# Altium footprint library 19-Resistors.PcbLib: 199 footprints (part 11 of 13)
Each footprint in its own frame and in the unit in brackets; x right, y up, seen from the top. Pads: shape width x height; smd on the part's side, far side on the other; paste and mask are expansions set on the pad; w line width, h text height; cw(c..) or ccw(c..) is an arc to the next point about the centre after c.
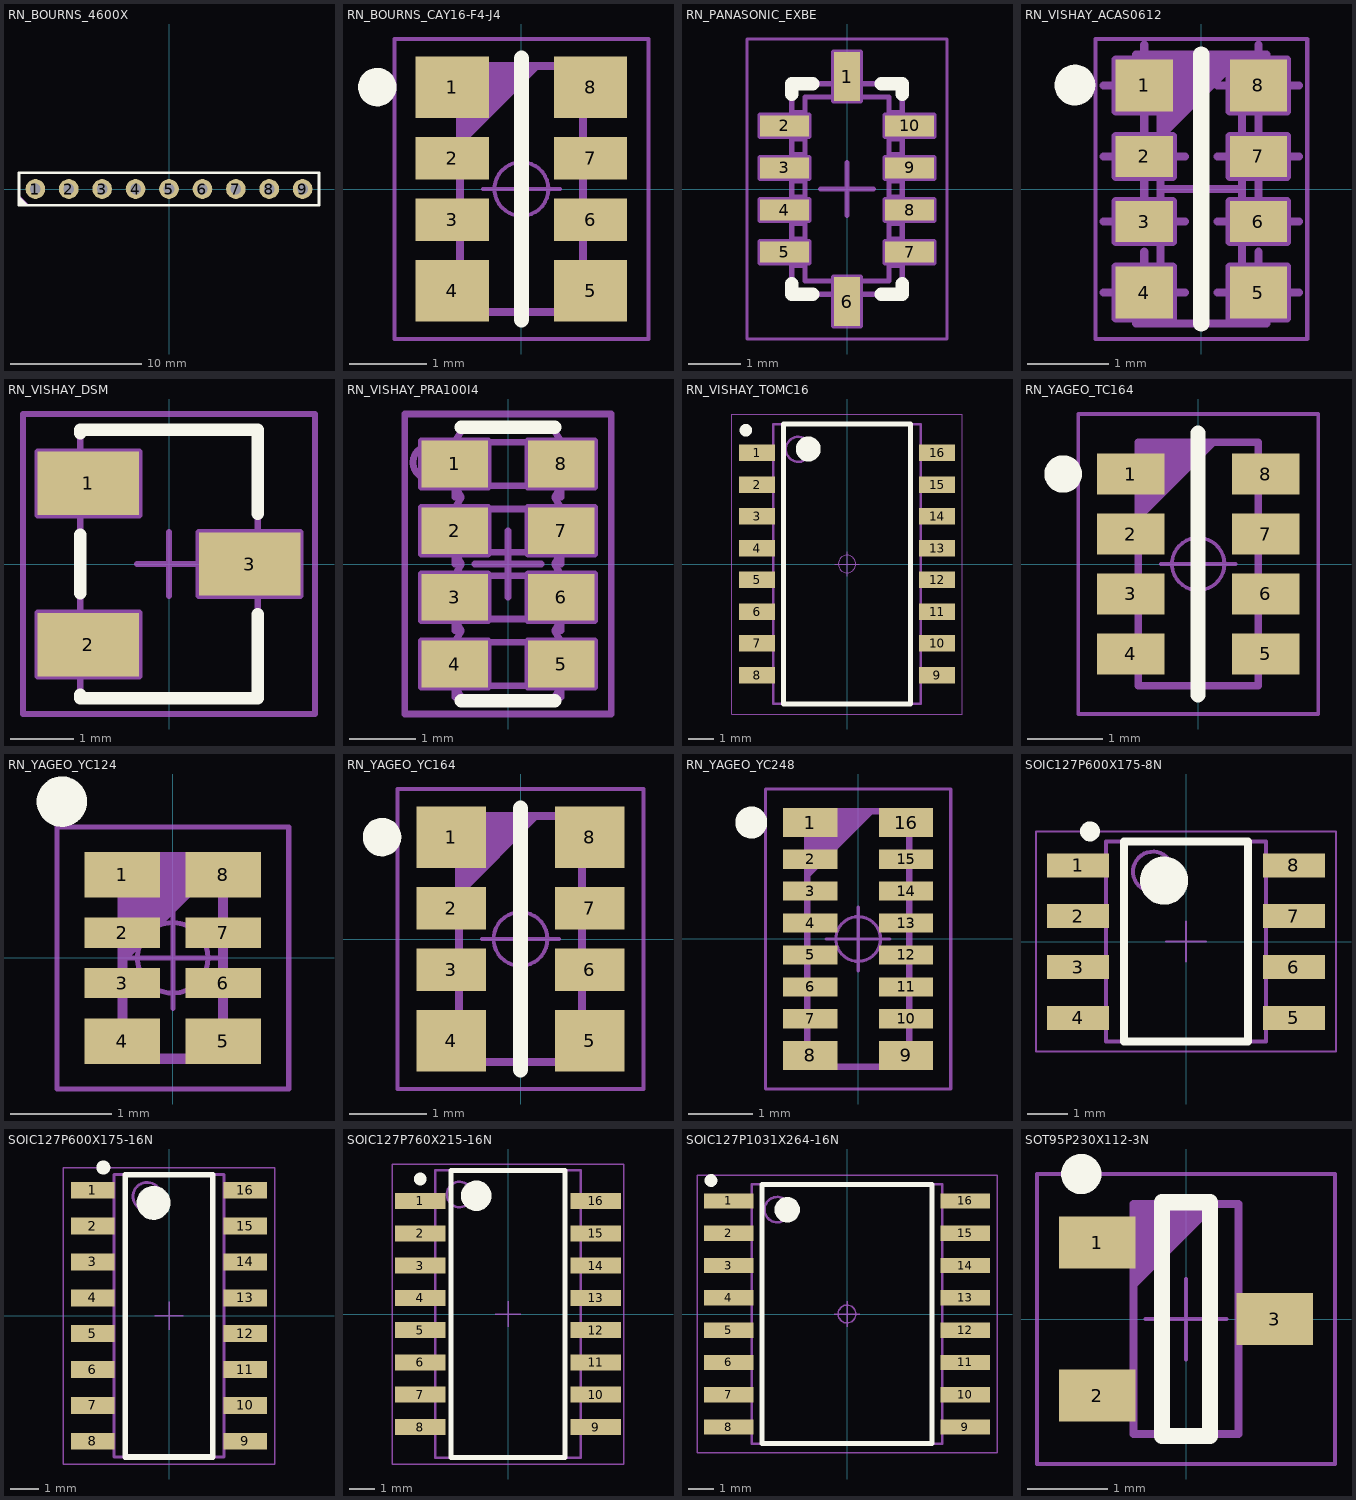
[diagram p10: the footprints below, top view; thin cyan lines are the x and y axes]

## RN_BOURNS_4600X [mm] "SIP-9 Resistor Network, Body 22.81x 2.49mm, Bourns Serie 4600X"
height 5.08
pads (9):
  round 1.5 hole 0.8: 1(-10.16,0) 2(-7.62,0) 3(-5.08,0) 4(-2.54,0) 5(0,0) 6(2.54,0) 7(5.08,0) 8(7.62,0) 9(10.16,0)
Top Overlay:
  lines w0.2: -11.39,-1.09 -11.24,-1.24 ; -11.39,-0.94 -11.09,-1.24 ; -11.39,-0.815 -10.965,-1.24 ; -11.39,-0.64 -10.79,-1.24 ; -11.405,-1.245 11.405,-1.245 11.405,1.245 -11.405,1.245 -11.405,-1.245
Mechanical 8:
  lines w0.127: -10.66,0 -10.16,0 ; -10.16,-0.5 -10.16,0 ; -10.16,0.5 -10.16,0 ; -9.66,0 -10.16,0 ; -8.12,0 -7.62,0 ; -7.62,-0.5 -7.62,0 ; -7.62,0.5 -7.62,0 ; -7.12,0 -7.62,0 ; -5.58,0 -5.08,0 ; -5.08,-0.5 -5.08,0 ; -5.08,0.5 -5.08,0 ; -4.58,0 -5.08,0 ; -3.04,0 -2.54,0 ; -2.54,-0.5 -2.54,0 ; -2.54,0.5 -2.54,0 ; -2.04,0 -2.54,0 ; -0.5,0 0,0 ; 0,-0.5 0,0 ; 0,0.5 0,0 ; 0.5,0 0,0 ; 2.04,0 2.54,0 ; 2.54,-0.5 2.54,0 ; 2.54,0.5 2.54,0 ; 3.04,0 2.54,0 ; 4.58,0 5.08,0 ; 5.08,-0.5 5.08,0 ; 5.08,0.5 5.08,0 ; 5.58,0 5.08,0 ; 7.12,0 7.62,0 ; 7.62,-0.5 7.62,0 ; 7.62,0.5 7.62,0 ; 8.12,0 7.62,0 ; 9.66,0 10.16,0 ; 10.16,-0.5 10.16,0 ; 10.16,0.5 10.16,0 ; 10.66,0 10.16,0
Mechanical 14:
  lines w0.1: -11.39,-1.165 -11.315,-1.24 ; -11.39,-1.065 -11.215,-1.24 ; -11.39,-0.99 -11.14,-1.24 ; -11.39,-0.915 -11.065,-1.24 ; -11.39,-0.84 -10.99,-1.24 ; -11.39,-0.765 -10.915,-1.24 ; -11.39,-0.69 -10.84,-1.24 ; -11.39,-0.565 -10.715,-1.24 ; -11.405,-1.245 11.405,-1.245 11.405,1.245 -11.405,1.245 -11.405,-1.245
3D body "v200-130.stp": height 0.02, standoff -1.65, extent 9.16,-1 11.16,1
3D body "v200-130.stp": height 0.02, standoff -1.65, extent 6.62,-1 8.62,1
3D body "v200-130.stp": height 0.02, standoff -1.65, extent 4.08,-1 6.08,1
3D body "v200-130.stp": height 0.02, standoff -1.65, extent 1.54,-1 3.54,1
3D body "v200-130.stp": height 0.02, standoff -1.65, extent -1,-1 1,1
3D body "v200-130.stp": height 0.02, standoff -1.65, extent -3.54,-1 -1.54,1
3D body "v200-130.stp": height 0.02, standoff -1.65, extent -6.08,-1 -4.08,1
3D body "v200-130.stp": height 0.02, standoff -1.65, extent -8.62,-1 -6.62,1
3D body "v200-130.stp": height 0.02, standoff -1.65, extent -11.16,-1 -9.16,1
3D body "RN_BOURNS_4600X.stp": height 5.08, standoff -3.43, extent -11.405,-1.245 11.405,1.245

## RN_BOURNS_CAY16-F4-J4 [mm] "Resistor, Chip Array, Convex S Version, Pitch 0.80mm, 8-Leads,1.6x3.2mm, BOURNS Type CAY16-F4 or J4, IPC Medium Density"
height 0.6
pads (8):
  rect 0.95x0.8 smd: 1(-0.9,1.325) 4(-0.9,-1.325) 5(0.9,-1.325) 8(0.9,1.325)
  rect 0.95x0.55 smd: 2(-0.9,0.4) 3(-0.9,-0.4) 6(0.9,-0.4) 7(0.9,0.4)
Top Overlay:
  circle w0.25: c-1.875,1.325 r0.125
  lines w0.2: 0,-1.7 0,1.7
Mechanical 14:
  lines w0.1: -0.8,-1.6 -0.8,1.6 0.8,1.6 0.8,-1.6 -0.8,-1.6 ; -0.8,0.6 0.2,1.6 -0.8,0.6 ; -0.8,0.7 0.1,1.6 -0.8,0.7 ; -0.8,0.8 0,1.6 -0.8,0.8 ; -0.8,0.9 -0.1,1.6 -0.8,0.9 ; -0.8,1 -0.2,1.6 -0.8,1 ; -0.8,1.1 -0.3,1.6 -0.8,1.1 ; -0.8,1.2 -0.4,1.6 -0.8,1.2 ; -0.8,1.3 -0.5,1.6 -0.8,1.3 ; -0.8,1.4 -0.6,1.6 -0.8,1.4 ; -0.8,1.5 -0.7,1.6 -0.8,1.5
Mechanical 15:
  circle w0.05: c0,0 r0.35
  lines w0.05: -0.5,0 0.5,0 ; 0,-0.5 0,0.5 ; -1.65,-1.95 -1.65,1.95 1.65,1.95 1.65,-1.95 -1.65,-1.95
3D body "p095-055.stp": height 0.02, standoff 0, extent -1.375,-0.675 -0.425,-0.125
3D body "p095-055.stp": height 0.02, standoff 0, extent -1.375,0.125 -0.425,0.675
3D body "p095-055.stp": height 0.02, standoff 0, extent 0.425,-0.675 1.375,-0.125
3D body "p095-055.stp": height 0.02, standoff 0, extent 0.425,0.125 1.375,0.675
3D body "p095-080.stp": height 0.02, standoff 0, extent 0.425,-1.725 1.375,-0.925
3D body "p095-080.stp": height 0.02, standoff 0, extent -1.375,-1.725 -0.425,-0.925
3D body "p095-080.stp": height 0.02, standoff 0, extent 0.425,0.925 1.375,1.725
3D body "p095-080.stp": height 0.02, standoff 0, extent -1.375,0.925 -0.425,1.725
3D body "RN_BOURNS_CAY16-F4-J4.stp": height 0.5, standoff 0, extent -0.8,-1.65 0.8,1.65

## RN_PANASONIC_EXBE [mm] "Resistor, Chip Array, Concave, Pitch 0.80mm, 10 Pin, 2.1mm W X 4.0mm L X 2.3mm H, Type EXBE"
height 2.3
pads (10):
  rect 0.5x0.925 smd: 1(0,2.138) 6(0,-2.137)
  rect 0.925x0.4 smd: 2(-1.188,1.2) 3(-1.188,0.4) 4(-1.188,-0.4) 5(-1.188,-1.2) 7(1.188,-1.2) 8(1.188,-0.4) 9(1.188,0.4) 10(1.188,1.2)
Top Overlay:
  lines w0.25: -1.05,-1.8 -1.05,-2 -0.65,-2 ; -1.05,1.8 -1.05,2 -0.65,2 ; 0.65,-2 1.05,-2 1.05,-1.8 ; 0.65,2 1.05,2 1.05,1.8
Mechanical 8:
  lines w0.1: -0.5,0 0,0 ; 0,-0.5 0,0 ; 0,0.5 0,0 ; 0.5,0 0,0 ; -1.65,-1.4 -1.65,-1 ; -1.65,-1.4 -0.725,-1.4 -0.725,-1 -1.65,-1 ; -1.65,-1.4 -1.188,-1.2 -1.65,-1 ; -1.65,-0.6 -1.65,-0.2 ; -1.65,-0.6 -0.725,-0.6 -0.725,-0.2 -1.65,-0.2 ; -1.65,-0.6 -1.188,-0.4 -1.65,-0.2 ; -1.65,0.2 -1.65,0.6 ; -1.65,0.2 -0.725,0.2 -0.725,0.6 -1.65,0.6 ; -1.65,0.2 -1.188,0.4 -1.65,0.6 ; -1.65,1 -1.65,1.4 ; -1.65,1 -0.725,1 -0.725,1.4 -1.65,1.4 ; -1.65,1 -1.188,1.2 -1.65,1.4 ; -0.25,-2.6 0.25,-2.6 ; -0.25,-2.6 -0.25,-1.675 0.25,-1.675 0.25,-2.6 ; -0.25,-2.6 0,-2.137 0.25,-2.6 ; -0.25,2.6 0.25,2.6 ; -0.25,2.6 -0.25,1.675 0.25,1.675 0.25,2.6 ; -0.25,2.6 0,2.138 0.25,2.6 ; 1.65,-1.4 1.65,-1 ; 1.65,-1.4 0.725,-1.4 0.725,-1 1.65,-1 ; 1.65,-1.4 1.188,-1.2 1.65,-1 ; 1.65,-0.6 1.65,-0.2 ; 1.65,-0.6 0.725,-0.6 0.725,-0.2 1.65,-0.2 ; 1.65,-0.6 1.188,-0.4 1.65,-0.2 ; 1.65,0.2 1.65,0.6 ; 1.65,0.2 0.725,0.2 0.725,0.6 1.65,0.6 ; 1.65,0.2 1.188,0.4 1.65,0.6 ; 1.65,1 1.65,1.4 ; 1.65,1 0.725,1 0.725,1.4 1.65,1.4 ; 1.65,1 1.188,1.2 1.65,1.4
Mechanical 14:
  lines w0.1: -1.05,-1.45 -0.8,-1.45 ; -1.05,-0.95 -0.8,-0.95 ; -1.05,-0.65 -0.8,-0.65 ; -1.05,-0.15 -0.8,-0.15 ; -1.05,0.15 -0.8,0.15 ; -1.05,0.65 -0.8,0.65 ; -1.05,0.95 -0.8,0.95 ; -1.05,1.45 -0.8,1.45 ; -0.25,-2 -0.25,-1.75 ; -0.25,1.75 -0.25,2 ; 0.25,-2 0.25,-1.75 ; 0.25,1.75 0.25,2 ; 0.8,-1.45 1.05,-1.45 ; 0.8,-0.95 1.05,-0.95 ; 0.8,-0.65 1.05,-0.65 ; 0.8,-0.15 1.05,-0.15 ; 0.8,0.15 1.05,0.15 ; 0.8,0.65 1.05,0.65 ; 0.8,0.95 1.05,0.95 ; 0.8,1.45 1.05,1.45 ; -1.05,-2 -1.05,-1.35 ccw(c-1.05,-1.2) -1.05,-1.05 -1.05,-0.55 ccw(c-1.05,-0.4) -1.05,-0.25 -1.05,0.25 ccw(c-1.05,0.4) -1.05,0.55 -1.05,1.05 ccw(c-1.05,1.2) -1.05,1.35 -1.05,2 -0.15,2 ccw(c0,2) 0.15,2 1.05,2 1.05,1.35 ccw(c1.05,1.2) 1.05,1.05 1.05,0.55 ccw(c1.05,0.4) 1.05,0.25 1.05,-0.25 ccw(c1.05,-0.4) 1.05,-0.55 1.05,-1.05 ccw(c1.05,-1.2) 1.05,-1.35 1.05,-2 0.15,-2 ccw(c0,-2) -0.15,-2 -1.05,-2 ; -0.8,-1.75 -0.8,1.75 0.8,1.75 0.8,-1.75 -0.8,-1.75
Mechanical 15:
  lines w0.05: -1.9,-2.85 -1.9,2.85 1.9,2.85 1.9,-2.85 -1.9,-2.85
3D body "p093-040.stp": height 0.02, standoff 0, extent -0.2,-2.615 0.2,-1.685
3D body "p093-040.stp": height 0.02, standoff 0, extent -0.2,1.66 0.2,2.59
3D body "p093-040.stp": height 0.02, standoff 0, extent -1.665,1 -0.735,1.4
3D body "p093-040.stp": height 0.02, standoff 0, extent -1.665,0.2 -0.735,0.6
3D body "p093-040.stp": height 0.02, standoff 0, extent -1.665,-0.6 -0.735,-0.2
3D body "p093-040.stp": height 0.02, standoff 0, extent -1.665,-1.4 -0.735,-1
3D body "p093-040.stp": height 0.02, standoff 0, extent 0.71,-1.4 1.64,-1
3D body "p093-040.stp": height 0.02, standoff 0, extent 0.71,-0.6 1.64,-0.2
3D body "p093-040.stp": height 0.02, standoff 0, extent 0.71,0.2 1.64,0.6
3D body "p093-040.stp": height 0.02, standoff 0, extent 0.71,1 1.64,1.4
3D body "RN_PANASONIC_EXBE.stp": height 0.65, standoff 0, extent -1.05,-2 1.05,2

## RN_VISHAY_ACAS0612 [mm] "Resistor, Chip Array, Convex S Version, Pitch 0.80mm, 8-Leads,1.5x3.2mm, VISHAY Type ACAS 0612, IPC Medium Density"
height 0.45
pads (8):
  rect 0.7x0.64 smd: 1(-0.7,1.27) 4(-0.7,-1.27) 5(0.7,-1.27) 8(0.7,1.27)
  rect 0.7x0.5 smd: 2(-0.7,0.4) 3(-0.7,-0.4) 6(0.7,-0.4) 7(0.7,0.4)
Top Overlay:
  circle w0.25: c-1.55,1.275 r0.125
  lines w0.2: 0,-1.65 0,1.65
Mechanical 8:
  lines w0.1: -1.2,-1.27 -0.7,-1.27 ; -1.2,-0.4 -0.7,-0.4 ; -1.2,0.4 -0.7,0.4 ; -1.2,1.27 -0.7,1.27 ; -0.7,-0.77 -0.7,-1.27 ; -0.7,0.1 -0.7,-0.4 ; -0.7,0.9 -0.7,0.4 ; -0.7,1.77 -0.7,1.27 ; -0.5,0 0,0 ; -0.2,-1.27 -0.7,-1.27 ; -0.2,-0.4 -0.7,-0.4 ; -0.2,0.4 -0.7,0.4 ; -0.2,1.27 -0.7,1.27 ; 0,-0.5 0,0 ; 0,0.5 0,0 ; 0.2,-1.27 0.7,-1.27 ; 0.2,-0.4 0.7,-0.4 ; 0.2,0.4 0.7,0.4 ; 0.2,1.27 0.7,1.27 ; 0.5,0 0,0 ; 0.7,-0.77 0.7,-1.27 ; 0.7,0.1 0.7,-0.4 ; 0.7,0.9 0.7,0.4 ; 0.7,1.77 0.7,1.27 ; 1.2,-1.27 0.7,-1.27 ; 1.2,-0.4 0.7,-0.4 ; 1.2,0.4 0.7,0.4 ; 1.2,1.27 0.7,1.27 ; -1.05,-1.59 -1.05,-0.95 -0.35,-0.95 -0.35,-1.59 -1.05,-1.59 ; -1.05,-0.65 -1.05,-0.15 -0.35,-0.15 -0.35,-0.65 -1.05,-0.65 ; -1.05,0.15 -1.05,0.65 -0.35,0.65 -0.35,0.15 -1.05,0.15 ; -1.05,0.95 -1.05,1.59 -0.35,1.59 -0.35,0.95 -1.05,0.95 ; 0.35,-1.59 0.35,-0.95 1.05,-0.95 1.05,-1.59 0.35,-1.59 ; 0.35,-0.65 0.35,-0.15 1.05,-0.15 1.05,-0.65 0.35,-0.65 ; 0.35,0.15 0.35,0.65 1.05,0.65 1.05,0.15 0.35,0.15 ; 0.35,0.95 0.35,1.59 1.05,1.59 1.05,0.95 0.35,0.95
Mechanical 14:
  lines w0.1: -0.5,-1.65 -0.5,1.65 ; -0.5,-1.027 cw(c-0.6,-0.825) -0.6,-1.05 -0.8,-1.05 -0.8,-1.65 0.8,-1.65 0.8,-1.05 0.6,-1.05 cw(c0.6,-0.825) 0.5,-1.027 ; -0.5,-0.623 ccw(c-0.6,-0.825) -0.6,-0.6 -0.8,-0.6 -0.8,-0.2 -0.6,-0.2 ccw(c-0.6,0) -0.5,-0.173 ; -0.5,0.173 ccw(c-0.6,0) -0.6,0.2 -0.8,0.2 -0.8,0.6 -0.6,0.6 ccw(c-0.6,0.825) -0.5,0.623 ; -0.5,1.027 ccw(c-0.6,0.825) -0.6,1.05 -0.8,1.05 -0.8,1.65 0.8,1.65 0.8,1.05 0.6,1.05 ccw(c0.6,0.825) 0.5,1.027 ; 0.5,-1.65 0.5,1.65 ; 0.5,-0.623 cw(c0.6,-0.825) 0.6,-0.6 0.8,-0.6 0.8,-0.2 0.6,-0.2 cw(c0.6,0) 0.5,-0.173 ; 0.5,0.173 cw(c0.6,0) 0.6,0.2 0.8,0.2 0.8,0.6 0.6,0.6 cw(c0.6,0.825) 0.5,0.623 ; 0.5,1.65 -0.5,0.65 0.5,1.65 ; -0.5,0.75 0.4,1.65 -0.5,0.75 ; -0.5,0.85 0.3,1.65 -0.5,0.85 ; -0.5,0.95 0.2,1.65 -0.5,0.95 ; -0.5,1.05 0.1,1.65 -0.5,1.05 ; -0.5,1.15 0,1.65 -0.5,1.15 ; -0.5,1.25 -0.1,1.65 -0.5,1.25 ; -0.5,1.35 -0.2,1.65 -0.5,1.35 ; -0.5,1.45 -0.3,1.65 -0.5,1.45 ; -0.5,1.55 -0.4,1.65 -0.5,1.55
Mechanical 15:
  lines w0.05: -1.3,-1.84 1.3,-1.84 1.3,1.84 -1.3,1.84 -1.3,-1.84
3D body "RN_VISHAY_ACAS0612.stp": height 0.55, standoff 0, extent -0.8,-1.65 0.8,1.65
3D body "p070-064.stp": height 0.02, standoff 0, extent -1.05,-1.595 -0.35,-0.955
3D body "p070-064.stp": height 0.02, standoff 0, extent 0.35,-1.595 1.05,-0.955
3D body "p070-064.stp": height 0.02, standoff 0, extent 0.35,0.945 1.05,1.585
3D body "p070-064.stp": height 0.02, standoff 0, extent -1.05,0.945 -0.35,1.585
3D body "p070-050.stp": height 0.02, standoff 0, extent -1.05,-0.65 -0.35,-0.15
3D body "p070-050.stp": height 0.02, standoff 0, extent -1.05,0.15 -0.35,0.65
3D body "p070-050.stp": height 0.02, standoff 0, extent 0.35,0.15 1.05,0.65
3D body "p070-050.stp": height 0.02, standoff 0, extent 0.35,-0.65 1.05,-0.15

## RN_VISHAY_DSM [mm] "SOT23 3-Leads, Pitch 1.25m - Body 2.7x4mm, DSM Serie"
height 1.8
pads (3):
  rect 1.6x1 smd: 1(-1.27,1.27) 2(-1.27,-1.27) 3(1.27,0)
Top Overlay:
  lines w0.2: -1.398,-2.06 -1.398,-2.113 1.398,-2.113 1.398,-0.79 ; -1.398,-0.46 -1.398,0.46 ; -1.398,2.06 -1.398,2.113 1.398,2.113 1.398,0.79
Mechanical 8:
  lines w0.1: -2.07,-1.27 -0.47,-1.27 ; -1.77,-1.27 -1.27,-1.27 ; -1.77,1.27 -1.27,1.27 ; -1.27,-1.77 -1.27,-1.27 ; -1.27,-0.77 -1.27,-1.27 ; -1.27,0.77 -1.27,1.27 ; -1.27,1.77 -1.27,1.27 ; -0.77,-1.27 -1.27,-1.27 ; -0.77,1.27 -1.27,1.27 ; -0.5,0 0,0 ; 0,-0.5 0,0 ; 0,0.5 0,0 ; 0.5,0 0,0 ; 0.77,0 1.27,0 ; 1.27,-0.5 1.27,0 ; 1.27,0.5 1.27,0 ; 1.77,0 1.27,0 ; -2.07,-1.77 -2.07,-0.77 -0.47,-0.77 -0.47,-1.77 -2.07,-1.77 ; -2.07,0.77 -2.07,1.77 -0.47,1.77 -0.47,0.77 -2.07,0.77 ; 0.47,-0.5 0.47,0.5 2.07,0.5 2.07,-0.5 0.47,-0.5
Mechanical 14:
  lines w0.1: -1.398,-1.67 -1.515,-1.67 -1.515,-0.87 -1.398,-0.87 ; -1.398,0.87 -1.515,0.87 -1.515,1.67 -1.385,1.67 ; 1.398,-0.4 1.515,-0.4 1.515,0.4 1.398,0.4 ; -1.398,2.113 -1.398,-2.113 1.398,-2.113 1.398,2.113 ; -1.398,2.113 1.398,2.113 ; -1.398,2.113 1.398,2.113
Mechanical 15:
  lines w0.1: -2.3,-2.363 -2.3,2.363 2.3,2.363 2.3,-2.363 -2.3,-2.363
3D body "p160-100.stp": height 0.02, standoff 0, extent -2.075,0.775 -0.475,1.775
3D body "p160-100.stp": height 0.02, standoff 0, extent -2.075,-1.775 -0.475,-0.775
3D body "p160-100.stp": height 0.02, standoff 0, extent 0.475,-0.5 2.075,0.5
3D body "RN_VISHAY_DSM.stp": height 1.8, standoff 0, extent -1.515,-2.113 1.515,2.113

## RN_VISHAY_PRA100I4 [mm] "Resistor, Chip Array, Pitch 1mm, 8 Pin, 1.60mm W X 4mm L X 0.50mm H, Serie PRA100"
height 0.5
pads (8):
  rect 1x0.7 smd: 1(-0.8,1.5) 2(-0.8,0.5) 3(-0.8,-0.5) 4(-0.8,-1.5) 5(0.8,-1.5) 6(0.8,-0.5) 7(0.8,0.5) 8(0.8,1.5)
Top Overlay:
  lines w0.2: -0.7,-2.05 0.7,-2.05 ; -0.7,2.05 0.7,2.05
Mechanical 8:
  lines w0.1: -1.3,-1.5 -0.8,-1.5 ; -1.3,-0.5 -0.8,-0.5 ; -1.3,0.5 -0.8,0.5 ; -1.3,1.5 -0.8,1.5 ; -0.8,-2 -0.8,-1.5 ; -0.8,-1 -0.8,-0.5 ; -0.8,0 -0.8,0.5 ; -0.8,1 -0.8,1.5 ; -0.5,0 0,0 ; -0.3,-1.5 -0.8,-1.5 ; -0.3,-0.5 -0.8,-0.5 ; -0.3,0.5 -0.8,0.5 ; -0.3,1.5 -0.8,1.5 ; 0,-0.5 0,0 ; 0,0.5 0,0 ; 0.3,-1.5 0.8,-1.5 ; 0.3,-0.5 0.8,-0.5 ; 0.3,0.5 0.8,0.5 ; 0.3,1.5 0.8,1.5 ; 0.5,0 0,0 ; 0.8,-2 0.8,-1.5 ; 0.8,-1 0.8,-0.5 ; 0.8,0 0.8,0.5 ; 0.8,1 0.8,1.5 ; 1.3,-1.5 0.8,-1.5 ; 1.3,-0.5 0.8,-0.5 ; 1.3,0.5 0.8,0.5 ; 1.3,1.5 0.8,1.5 ; -1.3,-1.85 -0.3,-1.85 -0.3,-1.15 -1.3,-1.15 -1.3,-1.85 ; -1.3,-0.85 -0.3,-0.85 -0.3,-0.15 -1.3,-0.15 -1.3,-0.85 ; -1.3,0.15 -0.3,0.15 -0.3,0.85 -1.3,0.85 -1.3,0.15 ; -1.3,1.15 -0.3,1.15 -0.3,1.85 -1.3,1.85 -1.3,1.15 ; 0.3,-1.85 1.3,-1.85 1.3,-1.15 0.3,-1.15 0.3,-1.85 ; 0.3,-0.85 1.3,-0.85 1.3,-0.15 0.3,-0.15 0.3,-0.85 ; 0.3,0.15 1.3,0.15 1.3,0.85 0.3,0.85 0.3,0.15 ; 0.3,1.15 1.3,1.15 1.3,1.85 0.3,1.85 0.3,1.15
Mechanical 14:
  circle w0.1: c-1.175,1.525 r0.25
  lines w0.1: -0.4,-1.825 -0.4,-1.175 ; -0.4,-0.825 -0.4,-0.175 ; 0.4,-1.825 0.4,-1.175 ; 0.4,-0.825 0.4,-0.175 ; 0.4,0.175 0.4,0.825 ; 0.4,1.175 0.4,1.825 ; -0.8,-1.825 0.8,-1.825 ; -0.8,-1.825 -0.7,-2 0.7,-2 0.8,-1.825 ; -0.8,-1.825 -0.8,-1.175 ; -0.8,-1.175 0.8,-1.175 ; -0.8,-1.175 -0.7,-1 -0.8,-0.825 ; -0.8,-0.825 0.8,-0.825 ; -0.8,-0.825 -0.8,-0.175 ; -0.8,-0.175 0.8,-0.175 ; -0.8,-0.175 -0.7,0 -0.8,0.175 ; -0.8,0.175 0.8,0.175 ; -0.8,0.175 -0.8,0.825 ; -0.8,0.825 0.8,0.825 ; -0.8,0.825 -0.7,1 -0.8,1.175 ; -0.8,1.175 0.8,1.175 ; -0.8,1.175 -0.8,1.825 ; -0.8,1.825 0.8,1.825 ; -0.8,1.825 -0.7,2 0.7,2 0.8,1.825 ; 0.8,-1.825 0.8,-1.175 ; 0.8,-1.175 0.7,-1 0.8,-0.825 ; 0.8,-0.825 0.8,-0.175 ; 0.8,-0.175 0.7,0 0.8,0.175 ; 0.8,0.175 0.8,0.825 ; 0.8,0.825 0.7,1 0.8,1.175 ; 0.8,1.175 0.8,1.825 ; -0.4,0.175 -0.4,0.825 -0.4,0.175 ; -0.4,1.175 -0.4,1.825 -0.4,1.175
Mechanical 15:
  lines w0.1: -1.55,-2.25 1.55,-2.25 1.55,2.25 -1.55,2.25 -1.55,-2.25
3D body "RN_VISHAY_PRA100I4.stp": height 0.5, standoff 0, extent -0.8,-2 0.8,2
3D body "p100-070.stp": height 0.02, standoff 0, extent -1.3,-1.85 -0.3,-1.15
3D body "p100-070.stp": height 0.02, standoff 0, extent -1.3,-0.85 -0.3,-0.15
3D body "p100-070.stp": height 0.02, standoff 0, extent -1.3,0.15 -0.3,0.85
3D body "p100-070.stp": height 0.02, standoff 0, extent -1.3,1.15 -0.3,1.85
3D body "p100-070.stp": height 0.02, standoff 0, extent 0.3,1.15 1.3,1.85
3D body "p100-070.stp": height 0.02, standoff 0, extent 0.3,0.15 1.3,0.85
3D body "p100-070.stp": height 0.02, standoff 0, extent 0.3,-0.85 1.3,-0.15
3D body "p100-070.stp": height 0.02, standoff 0, extent 0.3,-1.85 1.3,-1.15

## RN_VISHAY_TOMC16 [mm] "SOIC,1.27mm, Pitch;16 Pin, 5.89mm W X 11.176mm L X 2.03mm H body, Serie TOMC"
height 2.03
pads (16):
  rect 1.45x0.65 smd: 1(-3.6,4.445) 2(-3.6,3.175) 3(-3.6,1.905) 4(-3.6,0.635) 5(-3.6,-0.635) 6(-3.6,-1.905) 7(-3.6,-3.175) 8(-3.6,-4.445) 9(3.6,-4.445) 10(3.6,-3.175) 11(3.6,-1.905) 12(3.6,-0.635) 13(3.6,0.635) 14(3.6,1.905) 15(3.6,3.175) 16(3.6,4.445)
Top Overlay:
  circle w0.5: c-1.55,4.6 r0.25
  circle w0.25: c-4.05,5.35 r0.125
  lines w0.2: -2.55,-5.6 2.55,-5.6 2.55,5.6 -2.55,5.6 -2.55,-5.6
Mechanical 14:
  circle w0.1: c-1.945,4.588 r0.5
  lines w0.1: -2.945,-5.588 2.945,-5.588 2.945,5.588 -2.945,5.588 -2.945,-5.588
Mechanical 15:
  circle w0.05: c0,0 r0.35
  lines w0.05: -0.5,0 0.5,0 ; 0,-0.5 0,0.5 ; -4.6,-6 4.6,-6 4.6,6 -4.6,6 -4.6,-6
3D body "RN_VISHAY_TOMC16.stp": height 2.05, standoff -0.02, extent -3.796,-5.588 3.797,5.588
3D body "p145-065.stp": height 0.02, standoff 0, extent -4.325,4.12 -2.875,4.77
3D body "p145-065.stp": height 0.02, standoff 0, extent -4.325,2.85 -2.875,3.5
3D body "p145-065.stp": height 0.02, standoff 0, extent -4.325,1.5 -2.875,2.15
3D body "p145-065.stp": height 0.02, standoff 0, extent -4.325,0.31 -2.875,0.96
3D body "p145-065.stp": height 0.02, standoff 0, extent -4.325,-0.96 -2.875,-0.31
3D body "p145-065.stp": height 0.02, standoff 0, extent -4.325,-2.23 -2.875,-1.58
3D body "p145-065.stp": height 0.02, standoff 0, extent -4.325,-3.5 -2.875,-2.85
3D body "p145-065.stp": height 0.02, standoff 0, extent -4.325,-4.77 -2.875,-4.12
3D body "p145-065.stp": height 0.02, standoff 0, extent 2.875,-4.77 4.325,-4.12
3D body "p145-065.stp": height 0.02, standoff 0, extent 2.875,-3.5 4.325,-2.85
3D body "p145-065.stp": height 0.02, standoff 0, extent 2.875,-2.23 4.325,-1.58
3D body "p145-065.stp": height 0.02, standoff 0, extent 2.875,-0.96 4.325,-0.31
3D body "p145-065.stp": height 0.02, standoff 0, extent 2.875,0.31 4.325,0.96
3D body "p145-065.stp": height 0.02, standoff 0, extent 2.875,1.58 4.325,2.23
3D body "p145-065.stp": height 0.02, standoff 0, extent 2.875,2.85 4.325,3.5
3D body "p145-065.stp": height 0.02, standoff 0, extent 2.875,4.12 4.325,4.77

## RN_YAGEO_TC164 [mm] "Resistor, Chip Array, Concave, Pitch 0.80mm, 8 pin,1.60mm W X 3.20mm L X 0.70mm H, Type TC164, IPC Medium Density"
height 0.7
pads (8):
  rect 0.9x0.55 smd: 1(-0.9,1.2) 2(-0.9,0.4) 3(-0.9,-0.4) 4(-0.9,-1.2) 5(0.9,-1.2) 6(0.9,-0.4) 7(0.9,0.4) 8(0.9,1.2)
Top Overlay:
  circle w0.25: c-1.8,1.2 r0.125
  lines w0.2: 0,-1.75 0,1.75
Mechanical 14:
  lines w0.1: -0.8,0.625 0.2,1.625 ; -0.8,0.725 0.1,1.625 ; -0.8,0.825 0,1.625 ; -0.8,0.925 -0.1,1.625 ; -0.8,1.025 -0.2,1.625 ; -0.8,1.125 -0.3,1.625 ; -0.8,1.225 -0.4,1.625 ; -0.8,1.325 -0.5,1.625 ; -0.8,1.425 -0.6,1.625 ; -0.8,1.525 -0.7,1.625 ; -0.8,-1.625 0.8,-1.625 0.8,1.625 -0.8,1.625 -0.8,-1.625
Mechanical 15:
  circle w0.05: c0,0 r0.35
  lines w0.05: -0.5,0 0.5,0 ; 0,-0.5 0,0.5 ; -1.6,-2 1.6,-2 1.6,2 -1.6,2 -1.6,-2
3D body "p090-055.stp": height 0.02, standoff 0, extent 0.45,-1.475 1.35,-0.925
3D body "p090-055.stp": height 0.02, standoff 0, extent 0.45,-0.675 1.35,-0.125
3D body "p090-055.stp": height 0.02, standoff 0, extent 0.45,0.125 1.35,0.675
3D body "p090-055.stp": height 0.02, standoff 0, extent 0.45,0.925 1.35,1.475
3D body "p090-055.stp": height 0.02, standoff 0, extent -1.35,-1.475 -0.45,-0.925
3D body "p090-055.stp": height 0.02, standoff 0, extent -1.35,-0.675 -0.45,-0.125
3D body "p090-055.stp": height 0.02, standoff 0, extent -1.35,0.125 -0.45,0.675
3D body "p090-055.stp": height 0.02, standoff 0, extent -1.35,0.925 -0.45,1.475
3D body "RN_YAGEO_TC164.stp": height 0.7, standoff 0, extent -0.8,-1.65 0.8,1.65

## RN_YAGEO_YC124 [mm] "Resistor, Chip Array, Convex S Version, Pitch 0.50mm, 8 pin, 1mm W X 2mm L X 0.55mm H, Type YC124, IPC Medium Density"
height 0.7
pads (8):
  rect 0.75x0.45 smd: 1(-0.5,0.825) 4(-0.5,-0.825) 5(0.5,-0.825) 8(0.5,0.825)
  rect 0.75x0.3 smd: 2(-0.5,0.25) 3(-0.5,-0.25) 6(0.5,-0.25) 7(0.5,0.25)
Top Overlay:
  circle w0.25: c-1.1,1.55 r0.125
Mechanical 14:
  lines w0.1: 0.5,1 -0.5,0 0.5,1 ; 0.5,1 -0.5,1 -0.5,-1 0.5,-1 0.5,1 ; -0.5,0.1 0.4,1 -0.5,0.1 ; -0.5,0.2 0.3,1 -0.5,0.2 ; -0.5,0.3 0.2,1 -0.5,0.3 ; -0.5,0.4 0.1,1 -0.5,0.4 ; -0.5,0.5 0,1 -0.5,0.5 ; -0.5,0.6 -0.1,1 -0.5,0.6 ; -0.5,0.7 -0.2,1 -0.5,0.7 ; -0.5,0.8 -0.3,1 -0.5,0.8 ; -0.5,0.9 -0.4,1 -0.5,0.9
Mechanical 15:
  circle w0.05: c0,0 r0.35
  lines w0.05: -0.5,0 0.5,0 ; 0,-0.5 0,0.5 ; -1.15,-1.3 -1.15,1.3 1.15,1.3 1.15,-1.3 -1.15,-1.3
3D body "p075-030.stp": height 0.02, standoff 0, extent 0.125,-0.4 0.875,-0.1
3D body "p075-030.stp": height 0.02, standoff 0, extent 0.125,0.1 0.875,0.4
3D body "p075-030.stp": height 0.02, standoff 0, extent -0.875,-0.4 -0.125,-0.1
3D body "p075-030.stp": height 0.02, standoff 0, extent -0.875,0.1 -0.125,0.4
3D body "p075-045.stp": height 0.02, standoff 0, extent 0.125,-1.05 0.875,-0.6
3D body "p075-045.stp": height 0.02, standoff 0, extent -0.875,-1.05 -0.125,-0.6
3D body "p075-045.stp": height 0.02, standoff 0, extent 0.125,0.6 0.875,1.05
3D body "p075-045.stp": height 0.02, standoff 0, extent -0.875,0.6 -0.125,1.05
3D body "RN_YAGEO_YC124.stp": height 0.55, standoff 0, extent -0.55,-1.05 0.55,1.05

## RN_YAGEO_YC164 [mm] "Resistor, Chip Array, Convex S Version, Pitch 0.80mm, 8 pin, 1.60mm W X 3.20mm L X 0.70mm H, Type YC164, IPC Medium Density"
height 0.7
pads (8):
  rect 0.9x0.8 smd: 1(-0.9,1.325) 4(-0.9,-1.325) 5(0.9,-1.325) 8(0.9,1.325)
  rect 0.9x0.55 smd: 2(-0.9,0.4) 3(-0.9,-0.4) 6(0.9,-0.4) 7(0.9,0.4)
Top Overlay:
  circle w0.25: c-1.8,1.325 r0.125
  lines w0.2: 0,-1.7 0,1.7
Mechanical 14:
  lines w0.1: -0.8,-1.6 0.8,-1.6 0.8,1.6 -0.8,1.6 -0.8,-1.6 ; -0.8,0.6 0.2,1.6 -0.8,0.6 ; -0.8,0.7 0.1,1.6 -0.8,0.7 ; -0.8,0.8 0,1.6 -0.8,0.8 ; -0.8,0.9 -0.1,1.6 -0.8,0.9 ; -0.8,1 -0.2,1.6 -0.8,1 ; -0.8,1.1 -0.3,1.6 -0.8,1.1 ; -0.8,1.2 -0.4,1.6 -0.8,1.2 ; -0.8,1.3 -0.5,1.6 -0.8,1.3 ; -0.8,1.4 -0.6,1.6 -0.8,1.4 ; -0.8,1.5 -0.7,1.6 -0.8,1.5
Mechanical 15:
  circle w0.05: c0,0 r0.35
  lines w0.05: -0.5,0 0.5,0 ; 0,-0.5 0,0.5 ; -1.6,-1.95 1.6,-1.95 1.6,1.95 -1.6,1.95 -1.6,-1.95
3D body "p090-055.stp": height 0.02, standoff 0, extent 0.45,-0.675 1.35,-0.125
3D body "p090-055.stp": height 0.02, standoff 0, extent 0.45,0.125 1.35,0.675
3D body "p090-055.stp": height 0.02, standoff 0, extent -1.35,0.125 -0.45,0.675
3D body "p090-055.stp": height 0.02, standoff 0, extent -1.35,-0.675 -0.45,-0.125
3D body "p090-080.stp": height 0.02, standoff 0, extent -1.35,-1.75 -0.45,-0.95
3D body "p090-080.stp": height 0.02, standoff 0, extent 0.45,-1.725 1.35,-0.925
3D body "p090-080.stp": height 0.02, standoff 0, extent 0.45,0.925 1.35,1.725
3D body "p090-080.stp": height 0.02, standoff 0, extent -1.35,0.925 -0.45,1.725
3D body "RN_YAGEO_YC164.stp": height 0.7, standoff 0, extent -0.8,-1.65 0.8,1.65

## RN_YAGEO_YC248 [mm] "Resistor, Chip Array, 0.50mm pitch; 16 pin, 1.60mm W X 4mm L X 0.55mm H, YC248 Serie"
height 0.55
pads (16):
  rect 0.85x0.45 smd: 1(-0.75,1.825) 8(-0.75,-1.825) 9(0.75,-1.825) 16(0.75,1.825)
  rect 0.85x0.3 smd: 2(-0.75,1.25) 3(-0.75,0.75) 4(-0.75,0.25) 5(-0.75,-0.25) 6(-0.75,-0.75) 7(-0.75,-1.25) 10(0.75,-1.25) 11(0.75,-0.75) 12(0.75,-0.25) 13(0.75,0.25) 14(0.75,0.75) 15(0.75,1.25)
Top Overlay:
  circle w0.25: c-1.675,1.825 r0.125
Mechanical 14:
  lines w0.1: -0.8,-2 -0.8,2 0.8,2 0.8,-2 -0.8,-2 ; -0.8,1 0.2,2 -0.8,1 ; -0.8,1.1 0.1,2 -0.8,1.1 ; -0.8,1.2 0,2 -0.8,1.2 ; -0.8,1.3 -0.1,2 -0.8,1.3 ; -0.8,1.4 -0.2,2 -0.8,1.4 ; -0.8,1.5 -0.3,2 -0.8,1.5 ; -0.8,1.6 -0.4,2 -0.8,1.6 ; -0.8,1.7 -0.5,2 -0.8,1.7 ; -0.8,1.8 -0.6,2 -0.8,1.8 ; -0.8,1.9 -0.7,2 -0.8,1.9
Mechanical 15:
  circle w0.05: c0,0 r0.35
  lines w0.05: -0.5,0 0.5,0 ; 0,-0.5 0,0.5 ; -1.45,-2.35 -1.45,2.35 1.45,2.35 1.45,-2.35 -1.45,-2.35
3D body "RN_YAGEO_YC248.stp": height 0.45, standoff 0, extent -0.8,-2 0.8,2
3D body "p085-045.stp": height 0.02, standoff 0, extent -1.175,1.6 -0.325,2.05
3D body "p085-045.stp": height 0.02, standoff 0, extent 0.325,1.6 1.175,2.05
3D body "p085-045.stp": height 0.02, standoff 0, extent -1.175,-2.05 -0.325,-1.6
3D body "p085-045.stp": height 0.02, standoff 0, extent 0.325,-2.05 1.175,-1.6
3D body "p085-030.stp": height 0.02, standoff 0, extent -1.175,1.1 -0.325,1.4
3D body "p085-030.stp": height 0.02, standoff 0, extent -1.175,0.6 -0.325,0.9
3D body "p085-030.stp": height 0.02, standoff 0, extent -1.175,0.1 -0.325,0.4
3D body "p085-030.stp": height 0.02, standoff 0, extent -1.175,-0.4 -0.325,-0.1
3D body "p085-030.stp": height 0.02, standoff 0, extent -1.175,-0.9 -0.325,-0.6
3D body "p085-030.stp": height 0.02, standoff 0, extent -1.175,-1.4 -0.325,-1.1
3D body "p085-030.stp": height 0.02, standoff 0, extent 0.325,-1.4 1.175,-1.1
3D body "p085-030.stp": height 0.02, standoff 0, extent 0.325,-0.9 1.175,-0.6
3D body "p085-030.stp": height 0.02, standoff 0, extent 0.325,-0.4 1.175,-0.1
3D body "p085-030.stp": height 0.02, standoff 0, extent 0.325,0.1 1.175,0.4
3D body "p085-030.stp": height 0.02, standoff 0, extent 0.325,0.6 1.175,0.9
3D body "p085-030.stp": height 0.02, standoff 0, extent 0.325,1.1 1.175,1.4

## SOIC127P600X175-8N [mm] "SOIC 8, Pitch 1.27mm - Body 4x5mm, IPC Medium Density"
height 1.75
pads (8):
  rect 1.55x0.6 smd: 1(-2.7,1.905) 2(-2.7,0.635) 3(-2.7,-0.635) 4(-2.7,-1.905) 5(2.7,-1.905) 6(2.7,-0.635) 7(2.7,0.635) 8(2.7,1.905)
Top Overlay:
  circle w0.6: c-0.55,1.525 r0.3
  circle w0.25: c-2.4,2.755 r0.125
  lines w0.2: -1.55,-2.5 1.55,-2.5 1.55,2.5 -1.55,2.5 -1.55,-2.5
Mechanical 14:
  circle w0.1: c-0.825,1.75 r0.5
  lines w0.1: -2,-2.5 2,-2.5 2,2.5 -2,2.5 -2,-2.5
Mechanical 15:
  lines w0.05: -0.5,0 0.5,0 ; 0,-0.5 0,0.5 ; -3.75,-2.75 3.75,-2.75 3.75,2.75 -3.75,2.75 -3.75,-2.75
3D body "SOIC127P600X175-8N.stp": height 1.75, standoff 0, extent -3.1,-2.5 3.1,2.5
3D body "p155-060.stp": height 0.02, standoff 0, extent -3.475,1.605 -1.925,2.205
3D body "p155-060.stp": height 0.02, standoff 0, extent -3.475,0.335 -1.925,0.935
3D body "p155-060.stp": height 0.02, standoff 0, extent -3.475,-0.935 -1.925,-0.335
3D body "p155-060.stp": height 0.02, standoff 0, extent -3.475,-2.205 -1.925,-1.605
3D body "p155-060.stp": height 0.02, standoff 0, extent 1.925,-2.205 3.475,-1.605
3D body "p155-060.stp": height 0.02, standoff 0, extent 1.925,-0.935 3.475,-0.335
3D body "p155-060.stp": height 0.02, standoff 0, extent 1.925,0.335 3.475,0.935
3D body "p155-060.stp": height 0.02, standoff 0, extent 1.925,1.605 3.475,2.205

## SOIC127P600X175-16N [mm] "SOIC 16, Pitch 1.27mm - Body 4x10mm, IPC Medium Density"
height 1.75
pads (16):
  rect 1.55x0.6 smd: 1(-2.7,4.445) 2(-2.7,3.175) 3(-2.7,1.905) 4(-2.7,0.635) 5(-2.7,-0.635) 6(-2.7,-1.905) 7(-2.7,-3.175) 8(-2.7,-4.445) 9(2.7,-4.445) 10(2.7,-3.175) 11(2.7,-1.905) 12(2.7,-0.635) 13(2.7,0.635) 14(2.7,1.905) 15(2.7,3.175) 16(2.7,4.445)
Top Overlay:
  circle w0.6: c-0.55,4 r0.3
  circle w0.25: c-2.325,5.25 r0.125
  lines w0.2: -1.55,-5 1.55,-5 1.55,5 -1.55,5 -1.55,-5
Mechanical 14:
  circle w0.1: c-0.775,4.225 r0.5
  lines w0.1: -1.95,-5 -1.95,5 1.95,5 1.95,-5 -1.95,-5
Mechanical 15:
  lines w0.05: -0.5,0 0.5,0 ; 0,-0.5 0,0.5 ; -3.75,-5.25 3.75,-5.25 3.75,5.25 -3.75,5.25 -3.75,-5.25
3D body "SOIC127P600X175-16N.stp": height 1.75, standoff 0, extent -3.1,-5 3.1,5
3D body "p155-060.stp": height 0.02, standoff 0, extent -3.475,4.145 -1.925,4.745
3D body "p155-060.stp": height 0.02, standoff 0, extent -3.475,2.875 -1.925,3.475
3D body "p155-060.stp": height 0.02, standoff 0, extent -3.475,1.605 -1.925,2.205
3D body "p155-060.stp": height 0.02, standoff 0, extent -3.475,0.335 -1.925,0.935
3D body "p155-060.stp": height 0.02, standoff 0, extent -3.475,-0.935 -1.925,-0.335
3D body "p155-060.stp": height 0.02, standoff 0, extent -3.475,-2.205 -1.925,-1.605
3D body "p155-060.stp": height 0.02, standoff 0, extent -3.475,-3.475 -1.925,-2.875
3D body "p155-060.stp": height 0.02, standoff 0, extent -3.475,-4.745 -1.925,-4.145
3D body "p155-060.stp": height 0.02, standoff 0, extent 1.925,-4.745 3.475,-4.145
3D body "p155-060.stp": height 0.02, standoff 0, extent 1.925,-3.475 3.475,-2.875
3D body "p155-060.stp": height 0.02, standoff 0, extent 1.925,-2.205 3.475,-1.605
3D body "p155-060.stp": height 0.02, standoff 0, extent 1.925,-0.935 3.475,-0.335
3D body "p155-060.stp": height 0.02, standoff 0, extent 1.925,0.335 3.475,0.935
3D body "p155-060.stp": height 0.02, standoff 0, extent 1.925,1.605 3.475,2.205
3D body "p155-060.stp": height 0.02, standoff 0, extent 1.925,2.875 3.475,3.475
3D body "p155-060.stp": height 0.02, standoff 0, extent 1.925,4.145 3.475,4.745

## SOIC127P760X215-16N [mm] "SOIC, 16-Leads, Body 11.3x5.7mm (max), Pitch 1.27mm, IPC Medium Density"
height 2.15
pads (16):
  rect 2x0.63 smd: 1(-3.45,4.445) 2(-3.45,3.175) 3(-3.45,1.905) 4(-3.45,0.635) 5(-3.45,-0.635) 6(-3.45,-1.905) 7(-3.45,-3.175) 8(-3.45,-4.445) 9(3.45,-4.445) 10(3.45,-3.175) 11(3.45,-1.905) 12(3.45,-0.635) 13(3.45,0.635) 14(3.45,1.905) 15(3.45,3.175) 16(3.45,4.445)
Top Overlay:
  circle w0.6: c-1.25,4.65 r0.3
  circle w0.25: c-3.45,5.31 r0.125
  lines w0.2: -2.25,-5.65 2.25,-5.65 2.25,5.65 -2.25,5.65 -2.25,-5.65
Mechanical 14:
  circle w0.1: c-1.905,4.7 r0.5
  lines w0.1: -2.855,-5.65 2.855,-5.65 2.855,5.65 -2.855,5.65 -2.855,-5.65
Mechanical 15:
  lines w0.05: -0.5,0 0.5,0 ; 0,-0.5 0,0.5 ; -4.55,-5.9 4.55,-5.9 4.55,5.9 -4.55,5.9 -4.55,-5.9
3D body "p200-063.stp": height 0.02, standoff 0, extent 2.45,4.13 4.45,4.76
3D body "p200-063.stp": height 0.02, standoff 0, extent 2.45,2.86 4.45,3.49
3D body "p200-063.stp": height 0.02, standoff 0, extent 2.45,1.59 4.45,2.22
3D body "p200-063.stp": height 0.02, standoff 0, extent 2.45,0.32 4.45,0.95
3D body "p200-063.stp": height 0.02, standoff 0, extent 2.45,-0.95 4.45,-0.32
3D body "p200-063.stp": height 0.02, standoff 0, extent 2.45,-2.22 4.45,-1.59
3D body "p200-063.stp": height 0.02, standoff 0, extent 2.45,-3.49 4.45,-2.86
3D body "p200-063.stp": height 0.02, standoff 0, extent 2.45,-4.76 4.45,-4.13
3D body "p200-063.stp": height 0.02, standoff 0, extent -4.45,-4.76 -2.45,-4.13
3D body "p200-063.stp": height 0.02, standoff 0, extent -4.45,-3.49 -2.45,-2.86
3D body "p200-063.stp": height 0.02, standoff 0, extent -4.45,-2.22 -2.45,-1.59
3D body "p200-063.stp": height 0.02, standoff 0, extent -4.45,-0.95 -2.45,-0.32
3D body "p200-063.stp": height 0.02, standoff 0, extent -4.45,0.32 -2.45,0.95
3D body "p200-063.stp": height 0.02, standoff 0, extent -4.45,1.59 -2.45,2.22
3D body "p200-063.stp": height 0.02, standoff 0, extent -4.45,2.86 -2.45,3.49
3D body "p200-063.stp": height 0.02, standoff 0, extent -4.45,4.13 -2.45,4.76
3D body "SOIC127P760X215-16N.stp": height 2.15, standoff -0.02, extent -3.81,-5.65 3.81,5.65

## SOIC127P1031X264-16N [mm] "SOIC, 1.27mm Pitch;16 Pin, 7.49mm W X 10.21mm L X 2.64mm H body, IPC Medium Density"
height 2.64
pads (16):
  rect 1.95x0.6 smd: 1(-4.65,4.445) 2(-4.65,3.175) 3(-4.65,1.905) 4(-4.65,0.635) 5(-4.65,-0.635) 6(-4.65,-1.905) 7(-4.65,-3.175) 8(-4.65,-4.445) 9(4.65,-4.445) 10(4.65,-3.175) 11(4.65,-1.905) 12(4.65,-0.635) 13(4.65,0.635) 14(4.65,1.905) 15(4.65,3.175) 16(4.65,4.445)
Top Overlay:
  circle w0.5: c-2.35,4.1 r0.25
  circle w0.25: c-5.35,5.25 r0.125
  lines w0.2: -3.35,-5.1 3.35,-5.1 3.35,5.1 -3.35,5.1 -3.35,-5.1
Mechanical 14:
  circle w0.1: c-2.745,4.105 r0.5
  lines w0.1: -3.745,-5.105 3.745,-5.105 3.745,5.105 -3.745,5.105 -3.745,-5.105
Mechanical 15:
  circle w0.05: c0,0 r0.35
  lines w0.05: -0.5,0 0.5,0 ; 0,-0.5 0,0.5 ; -5.9,-5.45 5.9,-5.45 5.9,5.45 -5.9,5.45 -5.9,-5.45
3D body "SOIC127P1031X264-16N.stp": height 2.65, standoff 0, extent -5.215,-5.151 5.215,5.151
3D body "p195-060.stp": height 0.02, standoff 0, extent -5.625,4.145 -3.675,4.745
3D body "p195-060.stp": height 0.02, standoff 0, extent -5.625,2.875 -3.675,3.475
3D body "p195-060.stp": height 0.02, standoff 0, extent -5.625,1.605 -3.675,2.205
3D body "p195-060.stp": height 0.02, standoff 0, extent -5.625,0.335 -3.675,0.935
3D body "p195-060.stp": height 0.02, standoff 0, extent -5.625,-0.935 -3.675,-0.335
3D body "p195-060.stp": height 0.02, standoff 0, extent -5.625,-2.205 -3.675,-1.605
3D body "p195-060.stp": height 0.02, standoff 0, extent -5.625,-3.475 -3.675,-2.875
3D body "p195-060.stp": height 0.02, standoff 0, extent -5.625,-4.745 -3.675,-4.145
3D body "p195-060.stp": height 0.02, standoff 0, extent 3.675,-4.745 5.625,-4.145
3D body "p195-060.stp": height 0.02, standoff 0, extent 3.675,-3.475 5.625,-2.875
3D body "p195-060.stp": height 0.02, standoff 0, extent 3.675,-2.205 5.625,-1.605
3D body "p195-060.stp": height 0.02, standoff 0, extent 3.675,-0.935 5.625,-0.335
3D body "p195-060.stp": height 0.02, standoff 0, extent 3.675,0.335 5.625,0.935
3D body "p195-060.stp": height 0.02, standoff 0, extent 3.675,1.605 5.625,2.205
3D body "p195-060.stp": height 0.02, standoff 0, extent 3.675,2.875 5.625,3.475
3D body "p195-060.stp": height 0.02, standoff 0, extent 3.675,4.145 5.625,4.745

## SOT95P230X112-3N [mm] "SOT23 3-Leads, Pitch 0.95mm - Body 1.3x2.86mm, IPC Medium Density"
height 1.1
pads (3):
  rect 0.95x0.65 smd: 1(-1.1,0.95) 2(-1.1,-0.95) 3(1.1,0)
Top Overlay:
  circle w0.25: c-1.3,1.8 r0.125
  lines w0.2: -0.3,-1.45 -0.3,1.45 0.3,1.45 0.3,-1.45 -0.3,-1.45
Mechanical 14:
  lines w0.1: -0.65,0.43 0.35,1.43 ; -0.65,0.53 0.25,1.43 ; -0.65,0.63 0.15,1.43 ; -0.65,0.73 0.05,1.43 ; -0.65,0.83 -0.05,1.43 ; -0.65,0.93 -0.15,1.43 ; -0.65,1.03 -0.25,1.43 ; -0.65,1.13 -0.35,1.43 ; -0.65,1.23 -0.45,1.43 ; -0.65,1.33 -0.55,1.43 ; -0.65,-1.43 0.65,-1.43 0.65,1.43 -0.65,1.43 -0.65,-1.43
Mechanical 15:
  lines w0.05: -0.5,0 0.5,0 ; 0,-0.5 0,0.5 ; -1.85,-1.8 1.85,-1.8 1.85,1.8 -1.85,1.8 -1.85,-1.8
3D body "SOT95P240X110-3N.stp": height 1.1, standoff 0, extent -1.25,-1.5 1.25,1.5
3D body "p095-065.stp": height 0.02, standoff 0, extent -1.575,0.625 -0.625,1.275
3D body "p095-065.stp": height 0.02, standoff 0, extent 0.625,-0.325 1.575,0.325
3D body "p095-065.stp": height 0.02, standoff 0, extent -1.575,-1.275 -0.625,-0.625